# Altium footprint library 针脚编码开关.PcbLib: 16 footprints
Each footprint in its own frame and in the unit in brackets; x right, y up, seen from the top. Pads: shape width x height; smd on the part's side, far side on the other; paste and mask are expansions set on the pad; w line width, h text height; cw(c..) or ccw(c..) is an arc to the next point about the centre after c.
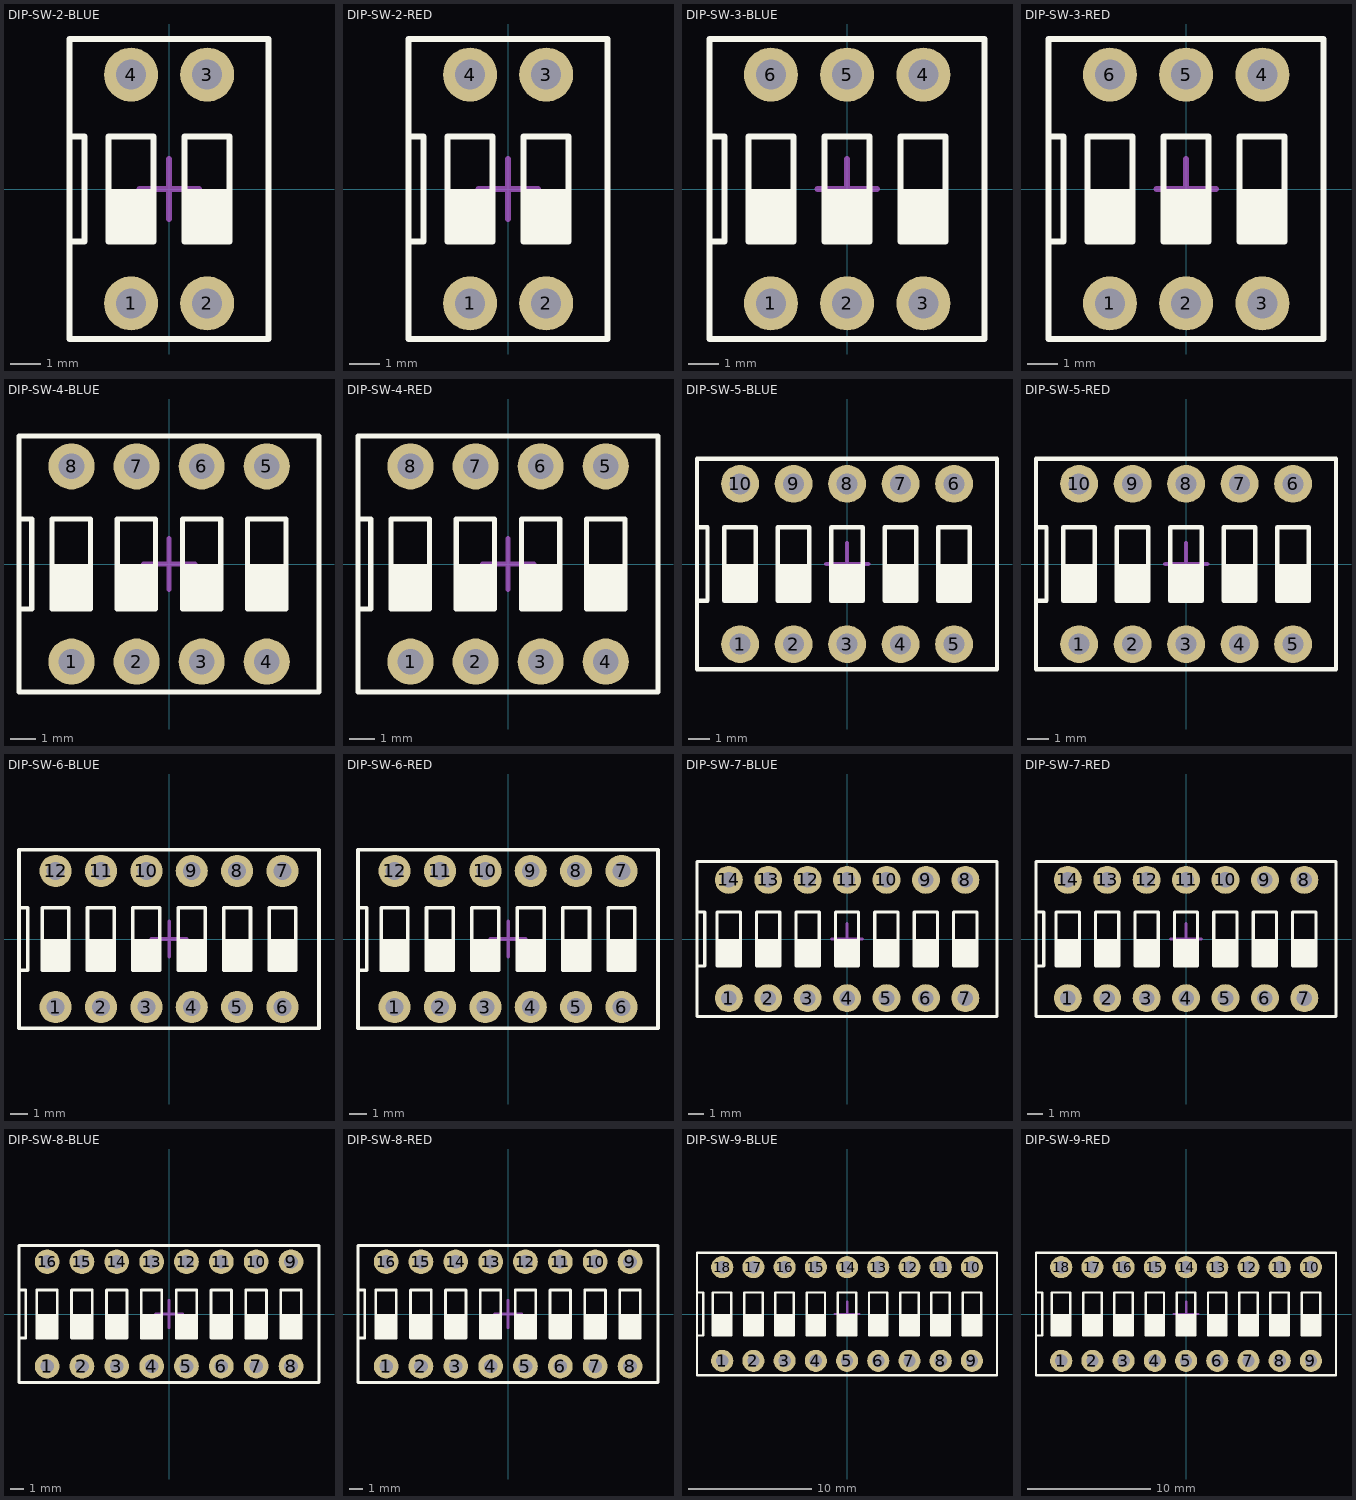
[diagram p0: the footprints below, top view; thin cyan lines are the x and y axes]

## DIP-SW-2-BLUE [mm] "DIP拔动开关 2 位"
height 6.9
pads (4):
  round 1.8 hole 1 unplated: 1(-1.27,-3.81) 2(1.27,-3.81) 3(1.27,3.81) 4(-1.27,3.81)
Top Overlay:
  rectangle: -2.025,-1.75 -0.525,0
  rectangle: -2.025,-1.75 -0.525,0
  rectangle: 0.515,-1.75 2.015,0
  lines w0.2: -3.32,-1.75 -2.82,-1.75 -2.82,1.75 -3.32,1.75 ; -3.32,-5 3.31,-5 3.31,5 -3.32,5 -3.32,-5 ; -2.025,-1.75 -2.025,1.75 -0.525,1.75 -0.525,-1.75 -2.025,-1.75 ; 0.515,-1.75 0.515,1.75 2.015,1.75 2.015,-1.75 0.515,-1.75
Mechanical 13:
  lines w0.05: -3.32,-5 -3.32,5 3.31,5 3.31,-5 -3.32,-5
Mechanical 15:
  lines w0.2: -0.991,0 1,0 ; 0,-1 0,1
3D body: height 6.45, standoff -4.1, extent -3.32,-5 3.31,5

## DIP-SW-2-RED [mm] "DIP拔动开关 2 位"
height 6.9
pads (4):
  round 1.8 hole 1 unplated: 1(-1.27,-3.81) 2(1.27,-3.81) 3(1.27,3.81) 4(-1.27,3.81)
Top Overlay:
  rectangle: -2.025,-1.75 -0.525,0
  rectangle: -2.025,-1.75 -0.525,0
  rectangle: 0.515,-1.75 2.015,0
  lines w0.2: -3.32,-1.75 -2.82,-1.75 -2.82,1.75 -3.32,1.75 ; -3.32,-5 3.31,-5 3.31,5 -3.32,5 -3.32,-5 ; -2.025,-1.75 -2.025,1.75 -0.525,1.75 -0.525,-1.75 -2.025,-1.75 ; 0.515,-1.75 0.515,1.75 2.015,1.75 2.015,-1.75 0.515,-1.75
Mechanical 13:
  lines w0.05: -3.32,-5 -3.32,5 3.31,5 3.31,-5 -3.32,-5
Mechanical 15:
  lines w0.2: -0.991,0 1,0 ; 0,-1 0,1
3D body: height 6.45, standoff -4.1, extent -3.32,-5 3.31,5

## DIP-SW-3-BLUE [mm] "DIP拔动开关 3 位"
height 6.9
pads (6):
  round 1.8 hole 1 unplated: 1(-2.54,-3.81) 2(0,-3.81) 3(2.54,-3.81) 4(2.54,3.81) 5(0,3.81) 6(-2.54,3.81)
Top Overlay:
  rectangle: -3.295,-1.75 -1.795,0
  rectangle: -3.295,-1.75 -1.795,0
  rectangle: -0.755,-1.75 0.745,0
  rectangle: 1.785,-1.75 3.285,0
  lines w0.2: -4.59,-1.75 -4.09,-1.75 -4.09,1.75 -4.59,1.75 ; -4.59,-5 4.58,-5 4.58,5 -4.59,5 -4.59,-5 ; -3.295,-1.75 -3.295,1.75 -1.795,1.75 -1.795,-1.75 -3.295,-1.75 ; -0.755,-1.75 -0.755,1.75 0.745,1.75 0.745,-1.75 -0.755,-1.75 ; 1.785,-1.75 1.785,1.75 3.285,1.75 3.285,-1.75 1.785,-1.75
Mechanical 13:
  lines w0.05: -4.59,-5 -4.59,5 4.58,5 4.58,-5 -4.59,-5
Mechanical 15:
  lines w0.2: -0.991,0 1,0 ; 0,-1 0,1
3D body: height 6.45, standoff -4.1, extent -4.59,-5 4.58,5

## DIP-SW-3-RED [mm] "DIP拔动开关 3 位"
height 6.9
pads (6):
  round 1.8 hole 1 unplated: 1(-2.54,-3.81) 2(0,-3.81) 3(2.54,-3.81) 4(2.54,3.81) 5(0,3.81) 6(-2.54,3.81)
Top Overlay:
  rectangle: 1.785,-1.75 3.285,0
  rectangle: -0.755,-1.75 0.745,0
  rectangle: -3.295,-1.75 -1.795,0
  rectangle: -3.295,-1.75 -1.795,0
  lines w0.2: -4.59,-1.75 -4.09,-1.75 -4.09,1.75 -4.59,1.75 ; -4.59,-5 -4.59,5 4.58,5 4.58,-5 -4.59,-5 ; -3.295,-1.75 -1.795,-1.75 -1.795,1.75 -3.295,1.75 -3.295,-1.75 ; -0.755,-1.75 0.745,-1.75 0.745,1.75 -0.755,1.75 -0.755,-1.75 ; 1.785,-1.75 3.285,-1.75 3.285,1.75 1.785,1.75 1.785,-1.75
Mechanical 13:
  lines w0.05: -4.59,-5 4.58,-5 4.58,5 -4.59,5 -4.59,-5
Mechanical 15:
  lines w0.2: -0.991,0 1,0 ; 0,-1 0,1
3D body: height 6.45, standoff -4.1, extent -4.59,-5 4.58,5

## DIP-SW-4-BLUE [mm] "DIP拔动开关 4 位"
height 6.9
pads (8):
  round 1.8 hole 1 unplated: 1(-3.81,-3.81) 2(-1.27,-3.81) 3(1.27,-3.81) 4(3.81,-3.81) 5(3.81,3.81) 6(1.27,3.81) 7(-1.27,3.81) 8(-3.81,3.81)
Top Overlay:
  rectangle: 3.055,-1.75 4.555,0
  rectangle: 0.515,-1.75 2.015,0
  rectangle: -2.025,-1.75 -0.525,0
  rectangle: -4.565,-1.75 -3.065,0
  rectangle: -4.565,-1.75 -3.065,0
  lines w0.2: -5.86,-1.75 -5.36,-1.75 -5.36,1.75 -5.86,1.75 ; -5.86,-5 -5.86,5 5.85,5 5.85,-5 -5.86,-5 ; -4.565,-1.75 -3.065,-1.75 -3.065,1.75 -4.565,1.75 -4.565,-1.75 ; -2.025,-1.75 -0.525,-1.75 -0.525,1.75 -2.025,1.75 -2.025,-1.75 ; 0.515,-1.75 2.015,-1.75 2.015,1.75 0.515,1.75 0.515,-1.75 ; 3.055,-1.75 4.555,-1.75 4.555,1.75 3.055,1.75 3.055,-1.75
Mechanical 13:
  lines w0.05: -5.86,-5 5.85,-5 5.85,5 -5.86,5 -5.86,-5
Mechanical 15:
  lines w0.2: -0.991,0 1,0 ; 0,-1 0,1
3D body: height 6.45, standoff -4.1, extent -5.86,-5 5.85,5

## DIP-SW-4-RED [mm] "DIP拔动开关 4 位"
height 6.9
pads (8):
  round 1.8 hole 1 unplated: 1(-3.81,-3.81) 2(-1.27,-3.81) 3(1.27,-3.81) 4(3.81,-3.81) 5(3.81,3.81) 6(1.27,3.81) 7(-1.27,3.81) 8(-3.81,3.81)
Top Overlay:
  rectangle: 3.055,-1.75 4.555,0
  rectangle: 0.515,-1.75 2.015,0
  rectangle: -2.025,-1.75 -0.525,0
  rectangle: -4.565,-1.75 -3.065,0
  rectangle: -4.565,-1.75 -3.065,0
  lines w0.2: -5.86,-1.75 -5.36,-1.75 -5.36,1.75 -5.86,1.75 ; -5.86,-5 -5.86,5 5.85,5 5.85,-5 -5.86,-5 ; -4.565,-1.75 -3.065,-1.75 -3.065,1.75 -4.565,1.75 -4.565,-1.75 ; -2.025,-1.75 -0.525,-1.75 -0.525,1.75 -2.025,1.75 -2.025,-1.75 ; 0.515,-1.75 2.015,-1.75 2.015,1.75 0.515,1.75 0.515,-1.75 ; 3.055,-1.75 4.555,-1.75 4.555,1.75 3.055,1.75 3.055,-1.75
Mechanical 13:
  lines w0.05: -5.86,-5 5.85,-5 5.85,5 -5.86,5 -5.86,-5
Mechanical 15:
  lines w0.2: -0.991,0 1,0 ; 0,-1 0,1
3D body: height 6.45, standoff -4.1, extent -5.86,-5 5.85,5

## DIP-SW-5-BLUE [mm] "DIP拔动开关 5 位"
height 6.9
pads (10):
  round 1.8 hole 1 unplated: 1(-5.08,-3.81) 2(-2.54,-3.81) 3(0,-3.81) 4(2.54,-3.81) 5(5.08,-3.81) 6(5.08,3.81) 7(2.54,3.81) 8(0,3.81) 9(-2.54,3.81) 10(-5.08,3.81)
Top Overlay:
  rectangle: 4.325,-1.75 5.825,0
  rectangle: 1.785,-1.75 3.285,0
  rectangle: -0.755,-1.75 0.745,0
  rectangle: -3.295,-1.75 -1.795,0
  rectangle: -5.835,-1.75 -4.335,0
  rectangle: -5.835,-1.75 -4.335,0
  lines w0.2: -7.13,-1.75 -6.63,-1.75 -6.63,1.75 -7.13,1.75 ; -7.13,-5 -7.13,5 7.12,5 7.12,-5 -7.13,-5 ; -5.835,-1.75 -4.335,-1.75 -4.335,1.75 -5.835,1.75 -5.835,-1.75 ; -3.295,-1.75 -1.795,-1.75 -1.795,1.75 -3.295,1.75 -3.295,-1.75 ; -0.755,-1.75 0.745,-1.75 0.745,1.75 -0.755,1.75 -0.755,-1.75 ; 1.785,-1.75 3.285,-1.75 3.285,1.75 1.785,1.75 1.785,-1.75 ; 4.325,-1.75 5.825,-1.75 5.825,1.75 4.325,1.75 4.325,-1.75
Mechanical 13:
  lines w0.05: -7.13,-5 7.12,-5 7.12,5 -7.13,5 -7.13,-5
Mechanical 15:
  lines w0.2: -0.991,0 1,0 ; 0,-1 0,1
3D body: height 6.45, standoff -4.1, extent -7.13,-5 7.12,5

## DIP-SW-5-RED [mm] "DIP拔动开关 5 位"
height 6.9
pads (10):
  round 1.8 hole 1 unplated: 1(-5.08,-3.81) 2(-2.54,-3.81) 3(0,-3.81) 4(2.54,-3.81) 5(5.08,-3.81) 6(5.08,3.81) 7(2.54,3.81) 8(0,3.81) 9(-2.54,3.81) 10(-5.08,3.81)
Top Overlay:
  rectangle: 4.325,-1.75 5.825,0
  rectangle: 1.785,-1.75 3.285,0
  rectangle: -0.755,-1.75 0.745,0
  rectangle: -3.295,-1.75 -1.795,0
  rectangle: -5.835,-1.75 -4.335,0
  rectangle: -5.835,-1.75 -4.335,0
  lines w0.2: -7.13,-1.75 -6.63,-1.75 -6.63,1.75 -7.13,1.75 ; -7.13,-5 -7.13,5 7.12,5 7.12,-5 -7.13,-5 ; -5.835,-1.75 -4.335,-1.75 -4.335,1.75 -5.835,1.75 -5.835,-1.75 ; -3.295,-1.75 -1.795,-1.75 -1.795,1.75 -3.295,1.75 -3.295,-1.75 ; -0.755,-1.75 0.745,-1.75 0.745,1.75 -0.755,1.75 -0.755,-1.75 ; 1.785,-1.75 3.285,-1.75 3.285,1.75 1.785,1.75 1.785,-1.75 ; 4.325,-1.75 5.825,-1.75 5.825,1.75 4.325,1.75 4.325,-1.75
Mechanical 13:
  lines w0.05: -7.13,-5 7.12,-5 7.12,5 -7.13,5 -7.13,-5
Mechanical 15:
  lines w0.2: -0.991,0 1,0 ; 0,-1 0,1
3D body: height 6.45, standoff -4.1, extent -7.13,-5 7.12,5

## DIP-SW-6-BLUE [mm] "DIP拔动开关 6 位"
height 6.9
pads (12):
  round 1.8 hole 1 unplated: 1(-6.35,-3.81) 2(-3.81,-3.81) 3(-1.27,-3.81) 4(1.27,-3.81) 5(3.81,-3.81) 6(6.35,-3.81) 7(6.35,3.81) 8(3.81,3.81) 9(1.27,3.81) 10(-1.27,3.81) 11(-3.81,3.81) 12(-6.35,3.81)
Top Overlay:
  rectangle: -7.105,-1.75 -5.605,0
  rectangle: -7.105,-1.75 -5.605,0
  rectangle: -4.565,-1.75 -3.065,0
  rectangle: -2.025,-1.75 -0.525,0
  rectangle: 0.515,-1.75 2.015,0
  rectangle: 3.055,-1.75 4.555,0
  rectangle: 5.595,-1.75 7.095,0
  lines w0.2: -8.4,-1.75 -7.9,-1.75 -7.9,1.75 -8.4,1.75 ; -8.4,-5 8.39,-5 8.39,5 -8.4,5 -8.4,-5 ; -7.105,-1.75 -7.105,1.75 -5.605,1.75 -5.605,-1.75 -7.105,-1.75 ; -4.565,-1.75 -4.565,1.75 -3.065,1.75 -3.065,-1.75 -4.565,-1.75 ; -2.025,-1.75 -2.025,1.75 -0.525,1.75 -0.525,-1.75 -2.025,-1.75 ; 0.515,-1.75 0.515,1.75 2.015,1.75 2.015,-1.75 0.515,-1.75 ; 3.055,-1.75 3.055,1.75 4.555,1.75 4.555,-1.75 3.055,-1.75 ; 5.595,-1.75 5.595,1.75 7.095,1.75 7.095,-1.75 5.595,-1.75
Mechanical 13:
  lines w0.05: -8.4,-5 -8.4,5 8.39,5 8.39,-5 -8.4,-5
Mechanical 15:
  lines w0.2: -0.991,0 1,0 ; 0,-1 0,1
3D body: height 6.45, standoff -4.1, extent -8.4,-5 8.39,5

## DIP-SW-6-RED [mm] "DIP拔动开关 6 位"
height 6.9
pads (12):
  round 1.8 hole 1 unplated: 1(-6.35,-3.81) 2(-3.81,-3.81) 3(-1.27,-3.81) 4(1.27,-3.81) 5(3.81,-3.81) 6(6.35,-3.81) 7(6.35,3.81) 8(3.81,3.81) 9(1.27,3.81) 10(-1.27,3.81) 11(-3.81,3.81) 12(-6.35,3.81)
Top Overlay:
  rectangle: -7.105,-1.75 -5.605,0
  rectangle: -7.105,-1.75 -5.605,0
  rectangle: -4.565,-1.75 -3.065,0
  rectangle: -2.025,-1.75 -0.525,0
  rectangle: 0.515,-1.75 2.015,0
  rectangle: 3.055,-1.75 4.555,0
  rectangle: 5.595,-1.75 7.095,0
  lines w0.2: -8.4,-1.75 -7.9,-1.75 -7.9,1.75 -8.4,1.75 ; -8.4,-5 8.39,-5 8.39,5 -8.4,5 -8.4,-5 ; -7.105,-1.75 -7.105,1.75 -5.605,1.75 -5.605,-1.75 -7.105,-1.75 ; -4.565,-1.75 -4.565,1.75 -3.065,1.75 -3.065,-1.75 -4.565,-1.75 ; -2.025,-1.75 -2.025,1.75 -0.525,1.75 -0.525,-1.75 -2.025,-1.75 ; 0.515,-1.75 0.515,1.75 2.015,1.75 2.015,-1.75 0.515,-1.75 ; 3.055,-1.75 3.055,1.75 4.555,1.75 4.555,-1.75 3.055,-1.75 ; 5.595,-1.75 5.595,1.75 7.095,1.75 7.095,-1.75 5.595,-1.75
Mechanical 13:
  lines w0.05: -8.4,-5 -8.4,5 8.39,5 8.39,-5 -8.4,-5
Mechanical 15:
  lines w0.2: -0.991,0 1,0 ; 0,-1 0,1
3D body: height 6.45, standoff -4.1, extent -8.4,-5 8.39,5

## DIP-SW-7-BLUE [mm] "DIP拔动开关7位"
height 6.9
pads (14):
  round 1.8 hole 1 unplated: 1(-7.62,-3.81) 2(-5.08,-3.81) 3(-2.54,-3.81) 4(0,-3.81) 5(2.54,-3.81) 6(5.08,-3.81) 7(7.62,-3.81) 8(7.62,3.81) 9(5.08,3.81) 10(2.54,3.81) 11(0,3.81) 12(-2.54,3.81) 13(-5.08,3.81) 14(-7.62,3.81)
Top Overlay:
  rectangle: -8.375,-1.75 -6.875,0
  rectangle: -8.375,-1.75 -6.875,0
  rectangle: -5.835,-1.75 -4.335,0
  rectangle: -3.295,-1.75 -1.795,0
  rectangle: -0.755,-1.75 0.745,0
  rectangle: 1.785,-1.75 3.285,0
  rectangle: 4.325,-1.75 5.825,0
  rectangle: 6.865,-1.75 8.365,0
  lines w0.2: -9.67,-1.75 -9.17,-1.75 -9.17,1.75 -9.67,1.75 ; -9.67,-5 9.66,-5 9.66,5 -9.67,5 -9.67,-5 ; -8.375,-1.75 -8.375,1.75 -6.875,1.75 -6.875,-1.75 -8.375,-1.75 ; -5.835,-1.75 -5.835,1.75 -4.335,1.75 -4.335,-1.75 -5.835,-1.75 ; -3.295,-1.75 -3.295,1.75 -1.795,1.75 -1.795,-1.75 -3.295,-1.75 ; -0.755,-1.75 -0.755,1.75 0.745,1.75 0.745,-1.75 -0.755,-1.75 ; 1.785,-1.75 1.785,1.75 3.285,1.75 3.285,-1.75 1.785,-1.75 ; 4.325,-1.75 4.325,1.75 5.825,1.75 5.825,-1.75 4.325,-1.75 ; 6.865,-1.75 6.865,1.75 8.365,1.75 8.365,-1.75 6.865,-1.75
Mechanical 13:
  lines w0.05: -9.67,-5 -9.67,5 9.66,5 9.66,-5 -9.67,-5
Mechanical 15:
  lines w0.2: -0.991,0 1,0 ; 0,-1 0,1
3D body: height 6.45, standoff -4.1, extent -9.67,-5 9.66,5

## DIP-SW-7-RED [mm] "DIP拔动开关 7位"
height 6.9
pads (14):
  round 1.8 hole 1 unplated: 1(-7.62,-3.81) 2(-5.08,-3.81) 3(-2.54,-3.81) 4(0,-3.81) 5(2.54,-3.81) 6(5.08,-3.81) 7(7.62,-3.81) 8(7.62,3.81) 9(5.08,3.81) 10(2.54,3.81) 11(0,3.81) 12(-2.54,3.81) 13(-5.08,3.81) 14(-7.62,3.81)
Top Overlay:
  rectangle: -8.375,-1.75 -6.875,0
  rectangle: -8.375,-1.75 -6.875,0
  rectangle: -5.835,-1.75 -4.335,0
  rectangle: -3.295,-1.75 -1.795,0
  rectangle: -0.755,-1.75 0.745,0
  rectangle: 1.785,-1.75 3.285,0
  rectangle: 4.325,-1.75 5.825,0
  rectangle: 6.865,-1.75 8.365,0
  lines w0.2: -9.67,-1.75 -9.17,-1.75 -9.17,1.75 -9.67,1.75 ; -9.67,-5 9.66,-5 9.66,5 -9.67,5 -9.67,-5 ; -8.375,-1.75 -8.375,1.75 -6.875,1.75 -6.875,-1.75 -8.375,-1.75 ; -5.835,-1.75 -5.835,1.75 -4.335,1.75 -4.335,-1.75 -5.835,-1.75 ; -3.295,-1.75 -3.295,1.75 -1.795,1.75 -1.795,-1.75 -3.295,-1.75 ; -0.755,-1.75 -0.755,1.75 0.745,1.75 0.745,-1.75 -0.755,-1.75 ; 1.785,-1.75 1.785,1.75 3.285,1.75 3.285,-1.75 1.785,-1.75 ; 4.325,-1.75 4.325,1.75 5.825,1.75 5.825,-1.75 4.325,-1.75 ; 6.865,-1.75 6.865,1.75 8.365,1.75 8.365,-1.75 6.865,-1.75
Mechanical 13:
  lines w0.05: -9.67,-5 -9.67,5 9.66,5 9.66,-5 -9.67,-5
Mechanical 15:
  lines w0.2: -0.991,0 1,0 ; 0,-1 0,1
3D body: height 6.45, standoff -4.1, extent -9.67,-5 9.66,5

## DIP-SW-8-BLUE [mm] "DIP拔动开关 8位"
height 6.9
pads (16):
  round 1.8 hole 1 unplated: 1(-8.89,-3.81) 2(-6.35,-3.81) 3(-3.81,-3.81) 4(-1.27,-3.81) 5(1.27,-3.81) 6(3.81,-3.81) 7(6.35,-3.81) 8(8.89,-3.81) 9(8.89,3.81) 10(6.35,3.81) 11(3.81,3.81) 12(1.27,3.81) 13(-1.27,3.81) 14(-3.81,3.81) 15(-6.35,3.81) 16(-8.89,3.81)
Top Overlay:
  rectangle: 8.135,-1.75 9.635,0
  rectangle: 5.595,-1.75 7.095,0
  rectangle: 3.055,-1.75 4.555,0
  rectangle: 0.515,-1.75 2.015,0
  rectangle: -2.025,-1.75 -0.525,0
  rectangle: -4.565,-1.75 -3.065,0
  rectangle: -7.105,-1.75 -5.605,0
  rectangle: -9.645,-1.75 -8.145,0
  rectangle: -9.645,-1.75 -8.145,0
  lines w0.2: -10.94,-1.75 -10.44,-1.75 -10.44,1.75 -10.94,1.75 ; -9.645,-1.75 -8.145,-1.75 ; -9.645,-1.75 -8.145,-1.75 ; -9.645,-1.75 -9.645,1.75 -8.145,1.75 -8.145,-1.75 ; -10.94,-5 -10.94,5 10.93,5 10.93,-5 -10.94,-5 ; -7.105,-1.75 -5.605,-1.75 -5.605,1.75 -7.105,1.75 -7.105,-1.75 ; -4.565,-1.75 -3.065,-1.75 -3.065,1.75 -4.565,1.75 -4.565,-1.75 ; -2.025,-1.75 -0.525,-1.75 -0.525,1.75 -2.025,1.75 -2.025,-1.75 ; 0.515,-1.75 2.015,-1.75 2.015,1.75 0.515,1.75 0.515,-1.75 ; 3.055,-1.75 4.555,-1.75 4.555,1.75 3.055,1.75 3.055,-1.75 ; 5.595,-1.75 7.095,-1.75 7.095,1.75 5.595,1.75 5.595,-1.75 ; 8.135,-1.75 9.635,-1.75 9.635,1.75 8.135,1.75 8.135,-1.75
Mechanical 13:
  lines w0.05: -10.94,-5 10.93,-5 10.93,5 -10.94,5 -10.94,-5
Mechanical 15:
  lines w0.2: -0.991,0 1,0 ; 0,-1 0,1
3D body: height 6.45, standoff -4.1, extent -10.94,-5 10.93,5

## DIP-SW-8-RED [mm] "DIP拔动开关 8位"
height 6.9
pads (16):
  round 1.8 hole 1 unplated: 1(-8.89,-3.81) 2(-6.35,-3.81) 3(-3.81,-3.81) 4(-1.27,-3.81) 5(1.27,-3.81) 6(3.81,-3.81) 7(6.35,-3.81) 8(8.89,-3.81) 9(8.89,3.81) 10(6.35,3.81) 11(3.81,3.81) 12(1.27,3.81) 13(-1.27,3.81) 14(-3.81,3.81) 15(-6.35,3.81) 16(-8.89,3.81)
Top Overlay:
  rectangle: 8.135,-1.75 9.635,0
  rectangle: 5.595,-1.75 7.095,0
  rectangle: 3.055,-1.75 4.555,0
  rectangle: 0.515,-1.75 2.015,0
  rectangle: -2.025,-1.75 -0.525,0
  rectangle: -4.565,-1.75 -3.065,0
  rectangle: -7.105,-1.75 -5.605,0
  rectangle: -9.645,-1.75 -8.145,0
  lines w0.2: -10.94,-1.75 -10.44,-1.75 -10.44,1.75 -10.94,1.75 ; -10.94,-5 10.93,-5 10.93,5 -10.94,5 -10.94,-5 ; -9.645,-1.75 -8.145,-1.75 -8.145,1.75 -9.645,1.75 -9.645,-1.75 ; -7.105,-1.75 -5.605,-1.75 -5.605,1.75 -7.105,1.75 -7.105,-1.75 ; -4.565,-1.75 -3.065,-1.75 -3.065,1.75 -4.565,1.75 -4.565,-1.75 ; -2.025,-1.75 -0.525,-1.75 -0.525,1.75 -2.025,1.75 -2.025,-1.75 ; 0.515,-1.75 2.015,-1.75 2.015,1.75 0.515,1.75 0.515,-1.75 ; 3.055,-1.75 4.555,-1.75 4.555,1.75 3.055,1.75 3.055,-1.75 ; 5.595,-1.75 7.095,-1.75 7.095,1.75 5.595,1.75 5.595,-1.75 ; 8.135,-1.75 9.635,-1.75 9.635,1.75 8.135,1.75 8.135,-1.75
Mechanical 13:
  lines w0.05: -10.94,-5 -10.94,5 10.93,5 10.93,-5 -10.94,-5
Mechanical 15:
  lines w0.2: -0.991,0 1,0 ; 0,-1 0,1
3D body: height 6.45, standoff -4.1, extent -10.94,-5 10.93,5

## DIP-SW-9-BLUE [mm] "DIP拔动开关 9位"
height 6.9
pads (18):
  round 1.8 hole 1 unplated: 1(-10.16,-3.81) 2(-7.62,-3.81) 3(-5.08,-3.81) 4(-2.54,-3.81) 5(0,-3.81) 6(2.54,-3.81) 7(5.08,-3.81) 8(7.62,-3.81) 9(10.16,-3.81) 10(10.16,3.81) 11(7.62,3.81) 12(5.08,3.81) 13(2.54,3.81) 14(0,3.81) 15(-2.54,3.81) 16(-5.08,3.81) 17(-7.62,3.81) 18(-10.16,3.81)
Top Overlay:
  rectangle: 9.405,-1.75 10.905,0
  rectangle: 6.865,-1.75 8.365,0
  rectangle: 4.325,-1.75 5.825,0
  rectangle: 1.785,-1.75 3.285,0
  rectangle: -0.755,-1.75 0.745,0
  rectangle: -3.295,-1.75 -1.795,0
  rectangle: -5.835,-1.75 -4.335,0
  rectangle: -8.375,-1.75 -6.875,0
  rectangle: -10.915,-1.75 -9.415,0
  rectangle: -10.915,-1.75 -9.415,0
  lines w0.2: -12.21,-1.75 -11.71,-1.75 -11.71,1.75 -12.21,1.75 ; -10.915,-1.75 -9.415,-1.75 ; -10.915,-1.75 -9.415,-1.75 ; -10.915,-1.75 -10.915,1.75 -9.415,1.75 -9.415,-1.75 ; -12.21,-5 12.2,-5 12.2,5 -12.21,5 -12.21,-5 ; -8.375,-1.75 -6.875,-1.75 -6.875,1.75 -8.375,1.75 -8.375,-1.75 ; -5.835,-1.75 -4.335,-1.75 -4.335,1.75 -5.835,1.75 -5.835,-1.75 ; -3.295,-1.75 -1.795,-1.75 -1.795,1.75 -3.295,1.75 -3.295,-1.75 ; -0.755,-1.75 0.745,-1.75 0.745,1.75 -0.755,1.75 -0.755,-1.75 ; 1.785,-1.75 3.285,-1.75 3.285,1.75 1.785,1.75 1.785,-1.75 ; 4.325,-1.75 5.825,-1.75 5.825,1.75 4.325,1.75 4.325,-1.75 ; 6.865,-1.75 8.365,-1.75 8.365,1.75 6.865,1.75 6.865,-1.75 ; 9.405,-1.75 10.905,-1.75 10.905,1.75 9.405,1.75 9.405,-1.75
Mechanical 13:
  lines w0.05: -12.21,-5 -12.21,5 12.2,5 12.2,-5 -12.21,-5
Mechanical 15:
  lines w0.2: -0.991,0 1,0 ; 0,-1 0,1
3D body: height 6.45, standoff -4.1, extent -12.21,-5 12.2,5

## DIP-SW-9-RED [mm] "DIP拔动开关 9位"
height 6.9
pads (18):
  round 1.8 hole 1 unplated: 1(-10.16,-3.81) 2(-7.62,-3.81) 3(-5.08,-3.81) 4(-2.54,-3.81) 5(0,-3.81) 6(2.54,-3.81) 7(5.08,-3.81) 8(7.62,-3.81) 9(10.16,-3.81) 10(10.16,3.81) 11(7.62,3.81) 12(5.08,3.81) 13(2.54,3.81) 14(0,3.81) 15(-2.54,3.81) 16(-5.08,3.81) 17(-7.62,3.81) 18(-10.16,3.81)
Top Overlay:
  rectangle: -10.915,-1.75 -9.415,0
  rectangle: -8.375,-1.75 -6.875,0
  rectangle: -5.835,-1.75 -4.335,0
  rectangle: -3.295,-1.75 -1.795,0
  rectangle: -0.755,-1.75 0.745,0
  rectangle: 1.785,-1.75 3.285,0
  rectangle: 4.325,-1.75 5.825,0
  rectangle: 6.865,-1.75 8.365,0
  rectangle: 9.405,-1.75 10.905,0
  lines w0.2: -12.21,-1.75 -11.71,-1.75 -11.71,1.75 -12.21,1.75 ; -12.21,-5 12.2,-5 12.2,5 -12.21,5 -12.21,-5 ; -10.915,-1.75 -10.915,1.75 -9.415,1.75 -9.415,-1.75 -10.915,-1.75 ; -8.375,-1.75 -8.375,1.75 -6.875,1.75 -6.875,-1.75 -8.375,-1.75 ; -5.835,-1.75 -5.835,1.75 -4.335,1.75 -4.335,-1.75 -5.835,-1.75 ; -3.295,-1.75 -3.295,1.75 -1.795,1.75 -1.795,-1.75 -3.295,-1.75 ; -0.755,-1.75 -0.755,1.75 0.745,1.75 0.745,-1.75 -0.755,-1.75 ; 1.785,-1.75 1.785,1.75 3.285,1.75 3.285,-1.75 1.785,-1.75 ; 4.325,-1.75 4.325,1.75 5.825,1.75 5.825,-1.75 4.325,-1.75 ; 6.865,-1.75 6.865,1.75 8.365,1.75 8.365,-1.75 6.865,-1.75 ; 9.405,-1.75 9.405,1.75 10.905,1.75 10.905,-1.75 9.405,-1.75
Mechanical 13:
  lines w0.05: -12.21,-5 -12.21,5 12.2,5 12.2,-5 -12.21,-5
Mechanical 15:
  lines w0.2: -0.991,0 1,0 ; 0,-1 0,1
3D body: height 6.45, standoff -4.1, extent -12.21,-5 12.2,5